# Altium footprint library LimeMicroAltiumLib.PcbLib: 760 footprints (part 39 of 50)
Each footprint in its own frame and in the unit in brackets; x right, y up, seen from the top. Pads: shape width x height; smd on the part's side, far side on the other; paste and mask are expansions set on the pad; w line width, h text height; cw(c..) or ccw(c..) is an arc to the next point about the centre after c.
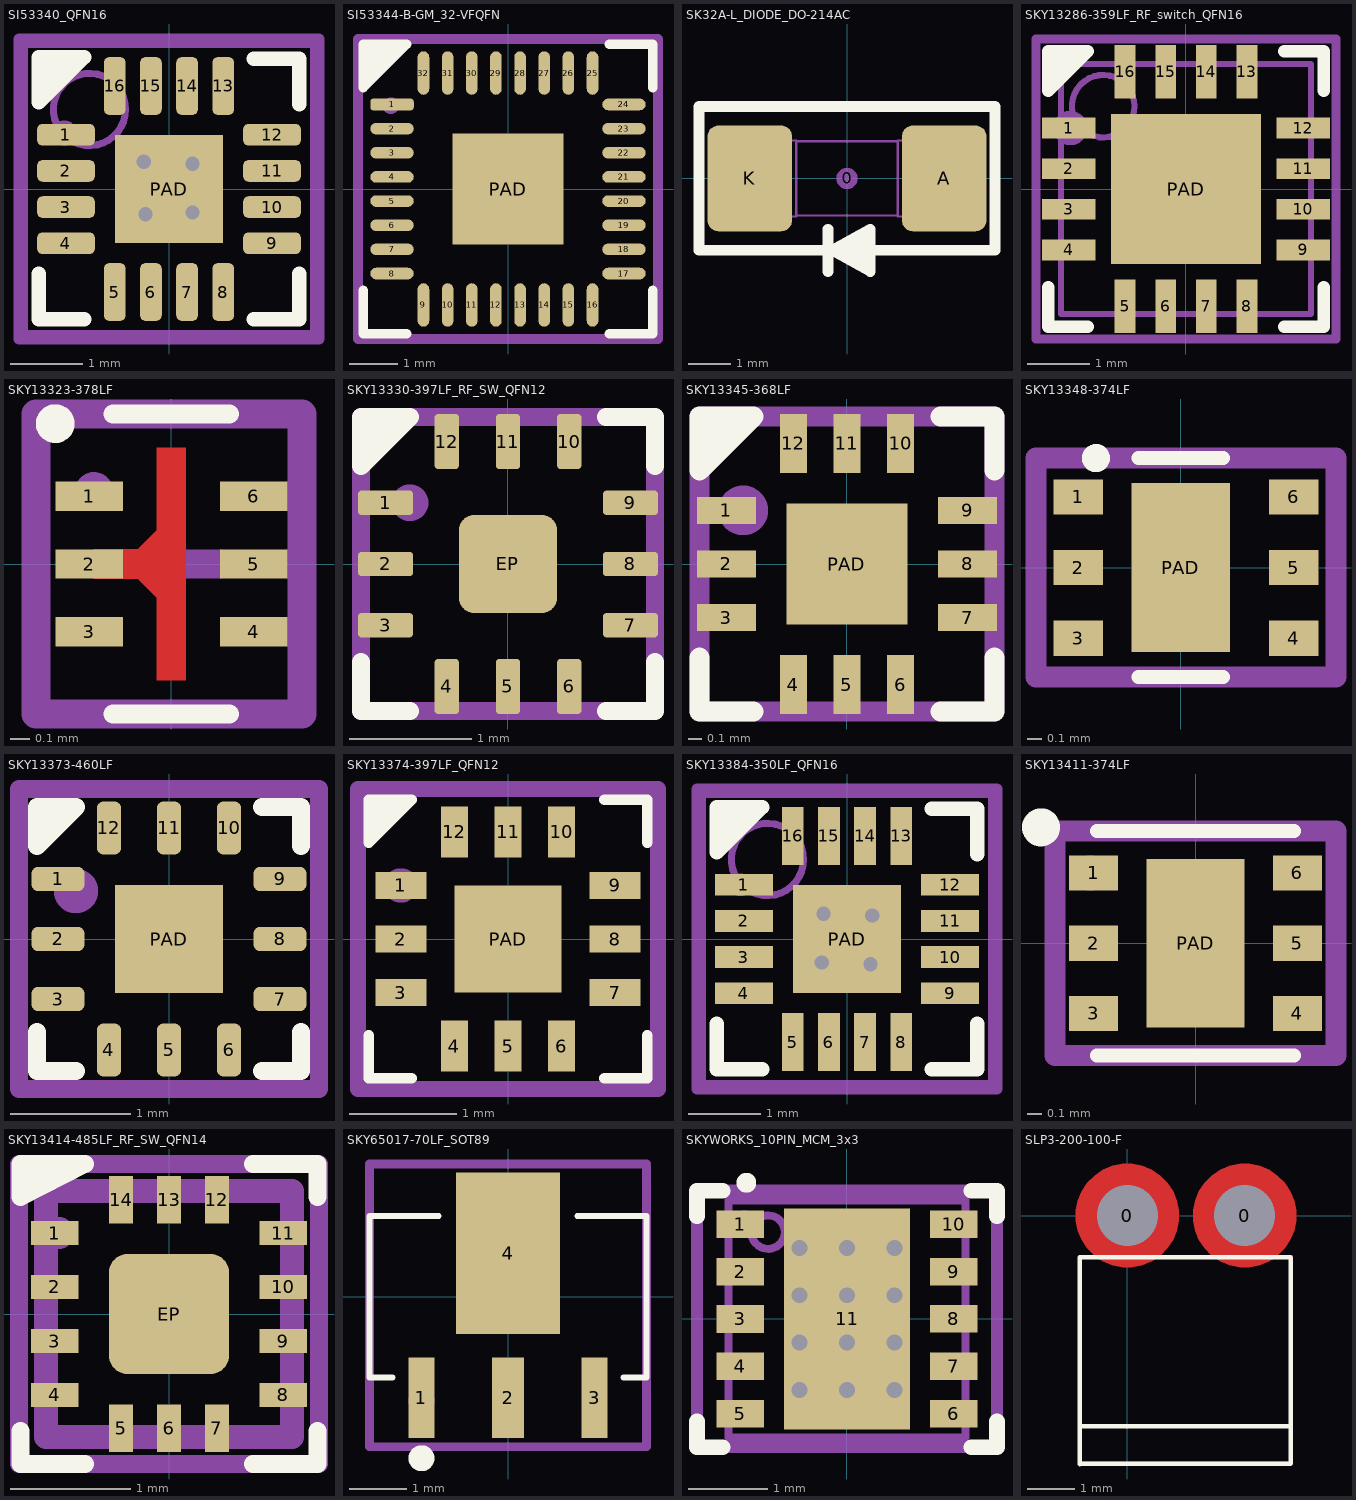
[diagram p38: the footprints below, top view; thin cyan lines are the x and y axes]

## SI53340_QFN16 [mm]
pads (17):
  rrect50% 0.8x0.3 smd mask+0.05: 1(-1.425,0.75) 2(-1.425,0.25) 3(-1.425,-0.25) 4(-1.425,-0.75) 9(1.425,-0.75) 10(1.425,-0.25) 11(1.425,0.25) 12(1.425,0.75)
  rrect50% 0.3x0.8 smd mask+0.05: 5(-0.75,-1.425) 6(-0.25,-1.425) 7(0.25,-1.425) 8(0.75,-1.425) 13(0.75,1.425) 14(0.25,1.425) 15(-0.25,1.425) 16(-0.75,1.425)
  rect 1.5x1.5 smd mask+0.05: PAD(0,0)
via -0.35,0.375 diameter 0.4 hole 0.2
via 0.325,0.35 diameter 0.4 hole 0.2
via 0.325,-0.325 diameter 0.4 hole 0.2
via -0.325,-0.35 diameter 0.4 hole 0.2
Top Overlay:
  region: -1.8,1.825 -1.8,1.2 -1.175,1.825
  lines w0.2: -1.8,-1.175 -1.8,-1.8 -1.175,-1.8 ; 1.175,-1.8 1.8,-1.8 1.8,-1.175 ; 1.175,1.8 1.8,1.8 1.8,1.175 ; -1.8,1.2 -1.175,1.825 -1.8,1.825 -1.8,1.2
Mechanical 13:
  circle w0.1: c-1.1,1.1 r0.5
  lines w0.1: -2,-2 2,-2 2,2 -2,2 -2,-2
Mechanical 15:
  circle w0.35: c-1.45,0.775 r0
  lines w0.15: -0.5,0 0.5,0 ; 0,-0.5 0,0.5 ; -2.075,-2.075 2.075,-2.075 2.075,2.075 -2.075,2.075 -2.075,-2.075
  text ".Designator" at 0,0 h0.55
3D body "User Library-qfn16-3x3.step": height 0.92, standoff 0, extent -1.5,-1.5 1.5,1.5

## SI53344-B-GM_32-VFQFN [mm]
pads (33):
  rrect50% 0.9x0.24 smd paste+0 mask+0.05: 1(-2.401,1.75)
  rrect100% 0.9x0.24 smd paste+0 mask+0.05: 2(-2.401,1.25) 3(-2.401,0.75) 4(-2.401,0.25) 5(-2.401,-0.25) 6(-2.401,-0.75) 7(-2.401,-1.25) 8(-2.401,-1.75) 17(2.401,-1.75) 18(2.401,-1.25) 19(2.401,-0.75) 20(2.401,-0.25) 21(2.401,0.25) 22(2.401,0.75) 23(2.401,1.25) 24(2.401,1.75)
  rrect100% 0.24x0.9 smd paste+0 mask+0.05: 9(-1.75,-2.401) 10(-1.25,-2.401) 11(-0.75,-2.401) 12(-0.25,-2.401) 13(0.25,-2.401) 14(0.75,-2.401) 15(1.25,-2.401) 16(1.75,-2.401) 25(1.75,2.401) 26(1.25,2.401) 27(0.75,2.401) 28(0.25,2.401) 29(-0.25,2.401) 30(-0.75,2.401) 31(-1.25,2.401) 32(-1.75,2.401)
  rect 2.3x2.3 smd paste+0 mask+0.05: PAD(0,0)
Top Overlay:
  region: -3,2.1 -3,3
  region: -3,2.1 -2.1,3 -3,3
  lines w0.2: -3,-2.1 -3,-3 -2.1,-3 ; 2.1,-3 3,-3 3,-2.1 ; 2.1,3 3,3 3,2.1 ; -3,2.1 -3,3 -2.1,3 -3,2.1
Mechanical 15:
  circle w0.2: c-2.425,1.725 r0.071
  lines w0.2: -0.85,0 0,0 ; 0,-0.85 0,0 ; 0,0.85 0,0 ; 0.85,0 0,0 ; -3.106,-3.106 -3.106,3.106 3.106,3.106 3.106,-3.106 -3.106,-3.106
  text ".Designator" at 0,0 h0.55
3D body "IC_Silicon_Labs_SI53344-B-GM_eec.STEP": height 0.25, standoff 0, extent -3.106,-3.106 3.106,3.106

## SK32A-L_DIODE_DO-214AC [mm]
pads (3):
  round 0.508 on Mech15: 0(0,0)
  rrect25% 2x2.5 smd: A(2.3,0) K(-2.3,0)
Top Overlay:
  lines w0.254: -0.45,-2.2 -0.45,-1.2 ; 0.05,-1.9 0.55,-1.9 ; 0.15,-1.5 0.55,-1.5 ; 0.55,-1.7 0.35,-1.7 -0.35,-1.7 ; -0.35,-1.7 0.55,-2.2 0.55,-1.2 -0.35,-1.7 ; -3.5,-1.7 -3.5,1.7 3.5,1.7 3.5,-1.7 -3.5,-1.7
Mechanical 13:
  lines w0.05: -1.2,-0.88 1.2,-0.88 ; -1.2,0.88 1.2,0.88 ; -1.7,-0.9 -1.7,0.9 -1.2,0.9 -1.2,-0.9 -1.7,-0.9 ; 1.2,-0.9 1.2,0.9 1.7,0.9 1.7,-0.9 1.2,-0.9
Mechanical 15:
  lines w0.15: -0.45,-2.2 -0.45,-1.2 ; 0.05,-1.9 0.55,-1.9 ; 0.15,-1.5 0.55,-1.5 ; 0.55,-1.7 0.35,-1.7 -0.35,-1.7 ; -0.35,-1.7 0.55,-1.2 0.55,-2.2 -0.35,-1.7 ; -3.5,-1.7 3.5,-1.7 3.5,1.7 -3.5,1.7 -3.5,-1.7
  text "A" at 1.7,-0.5 h0.55
  text "C" at -2.2,-0.5 h0.55
  text ".Designator" at 0,0 h0.55
3D body "User Library-DO-214AA SMB.step": height 2.3, standoff 0, extent -2.7,-1.8 2.7,1.8

## SKY13286-359LF_RF_switch_QFN16 [mm]
pads (17):
  rect 0.85x0.33 smd mask+0.05: 1(-1.875,0.975) 2(-1.875,0.325) 3(-1.875,-0.325) 4(-1.875,-0.975) 9(1.875,-0.975) 10(1.875,-0.325) 11(1.875,0.325) 12(1.875,0.975)
  rect 0.33x0.85 smd mask+0.05: 5(-0.975,-1.875) 6(-0.325,-1.875) 7(0.325,-1.875) 8(0.975,-1.875) 13(0.975,1.875) 14(0.325,1.875) 15(-0.325,1.875) 16(-0.975,1.875)
  rect 2.4x2.4 smd mask+0.05: PAD(0,0)
Top Overlay:
  region: -2.2,1.575 -2.2,2.2 -1.575,2.2
  lines w0.2: -2.2,-1.575 -2.2,-2.2 -1.575,-2.2 ; 1.575,-2.2 2.2,-2.2 2.2,-1.575 ; 1.575,2.2 2.2,2.2 2.2,1.575 ; -2.2,1.575 -2.2,2.2 -1.575,2.2 -2.2,1.575
Mechanical 13:
  circle w0.1: c-1.325,1.325 r0.5
  lines w0.1: -2,-2 -2,2 2,2 2,-2 -2,-2
Mechanical 15:
  circle w0.35: c-1.85,0.975 r0.1
  lines w0.15: -0.525,0.025 0.475,0.025 ; -0.025,-0.475 -0.025,0.525 ; -2.4,-2.4 -2.4,2.4 2.4,2.4 2.4,-2.4 -2.4,-2.4
  text ".Designator" at 0,0 h0.55
3D body "User Library-qfn16-4x4.step": height 0.92, standoff 0, extent -2,-2 2,2

## SKY13323-378LF [mm] "SKY13323-378LF RF switch"
pads (6):
  rect 0.35x0.15 smd paste-0.1 mask+0.05: 1(-0.425,0.35) 2(-0.425,0) 3(-0.425,-0.35) 4(0.425,-0.35) 5(0.425,0) 6(0.425,0.35)
Top Layer:
  region: -0.4,-0.075 -0.175,-0.075 -0.075,-0.175 -0.075,-0.6 0.075,-0.6 0.075,0 -0.4,0
  region: -0.4,0.075 -0.175,0.075 -0.075,0.175 -0.075,0.6 0.075,0.6 0.075,0 -0.4,0
Top Overlay:
  circle w0.1: c-0.6,0.725 r0.05
  lines w0.1: -0.3,-0.775 0.3,-0.775 ; -0.3,0.775 0.3,0.775
Top Paste:
  drawing of 24 lines, arcs and shapes, not listed
Mechanical 15:
  circle w0.1: c-0.4,0.375 r0.05
  lines w0.15: -0.25,0 0,0 ; 0,-0.25 0,0 ; 0,0.25 0,0 ; 0.25,0 0,0 ; -0.7,-0.775 -0.7,0.775 0.675,0.775 0.675,-0.775 -0.7,-0.775
  text ".Designator" at 0,0 h0.55
3D body: height 0.51, standoff 0.5, extent -0.425,0.225 -0.225,0.425
3D body: height 0.5, standoff 0, extent -0.5,-0.5 0.5,0.5

## SKY13330-397LF_RF_SW_QFN12 [mm]
pads (13):
  rrect30% 0.45x0.2 smd mask+0.05: 1(-1,0.5) 2(-1,0) 3(-1,-0.5) 7(1,-0.5) 8(1,0) 9(1,0.5)
  rrect30% 0.2x0.45 smd mask+0.05: 4(-0.5,-1) 5(0,-1) 6(0.5,-1) 10(0.5,1) 11(0,1) 12(-0.5,1)
  rrect30% 0.8x0.8 smd mask+0.05: EP(0,0)
Top Overlay:
  region: -1.2,0.8 -1.2,1.2 -0.8,1.2
  lines w0.15: -1.2,-0.8 -1.2,-1.2 -0.8,-1.2 ; 0.8,-1.2 1.2,-1.2 1.2,-0.8 ; 0.8,1.2 1.2,1.2 1.2,0.8 ; -1.2,0.8 -0.8,1.2 -1.2,1.2 -1.2,0.8
Mechanical 15:
  circle w0.2: c-0.8,0.5 r0.05
  lines w0.15: -0.3,0 0,0 ; 0,-0.3 0,0 ; 0,0.3 0,0 ; 0.3,0 0,0 ; -1.2,-1.2 1.2,-1.2 1.2,1.2 -1.2,1.2 -1.2,-1.2
  text ".Designator" at 0,0 h0.55
3D body: height 0.56, standoff 0, extent -0.899,0.6 -0.601,0.9
3D body: height 0.55, standoff 0, extent -1,-1 1,1

## SKY13345-368LF [mm]
pads (13):
  rect 0.44x0.2 smd mask+0.05: 1(-0.9,0.4) 2(-0.9,0) 3(-0.9,-0.4) 7(0.9,-0.4) 8(0.9,0) 9(0.9,0.4)
  rect 0.2x0.44 smd mask+0.05: 4(-0.4,-0.9) 5(0,-0.9) 6(0.4,-0.9) 10(0.4,0.9) 11(0,0.9) 12(-0.4,0.9)
  rect 0.9x0.9 smd mask+0.05: PAD(0,0)
Top Overlay:
  region: -1.1,0.65 -0.65,1.1 -1.1,1.1
  lines w0.15: -1.1,-0.7 -1.1,-1.1 -0.7,-1.1 ; 0.7,-1.1 1.1,-1.1 1.1,-0.7 ; 0.7,1.1 1.1,1.1 1.1,0.7 ; -1.1,0.7 -0.7,1.1 -1.1,1.1 -1.1,0.7
Mechanical 15:
  circle w0.3: c-0.775,0.4 r0.035
  lines w0.15: -0.2,0 0.2,0 ; 0,-0.2 0,0.2 ; -1.1,-1.1 -1.1,1.1 1.1,1.1 1.1,-1.1 -1.1,-1.1
  text ".Designator" at 0,0 h0.55
3D body: height 0.55, standoff 0, extent -1,-1 1,1
3D body: height 0.56, standoff 0, extent -0.849,0.65 -0.65,0.85

## SKY13348-374LF [mm] "SKY13348-374LF RF switch"
pads (7):
  rect 0.35x0.25 smd mask+0.05: 1(-0.725,0.5) 2(-0.725,0) 3(-0.725,-0.5) 4(0.8,-0.5) 5(0.8,0) 6(0.8,0.5)
  rect 0.7x1.2 smd mask+0.05: PAD(0,0)
Top Overlay:
  circle w0.1: c-0.6,0.775 r0.05
  lines w0.1: -0.3,-0.775 0.3,-0.775 ; -0.3,0.775 0.3,0.775
Mechanical 15:
  circle w0.1: c-0.75,0.5 r0.05
  lines w0.15: -0.25,0 0,0 ; 0,-0.25 0,0 ; 0,0.25 0,0 ; 0.25,0 0,0 ; -1.025,-0.775 -1.025,0.775 1.1,0.775 1.1,-0.775 -1.025,-0.775
  text ".Designator" at 0,0 h0.55
3D body: height 0.51, standoff 0.5, extent -0.625,0.45 -0.425,0.65
3D body: height 0.5, standoff 0, extent -0.725,-0.75 0.775,0.75

## SKY13373-460LF [mm]
pads (13):
  rrect50% 0.44x0.2 smd mask+0.05: 1(-0.925,0.5) 2(-0.925,0) 3(-0.925,-0.5) 7(0.925,-0.5) 8(0.925,0) 9(0.925,0.5)
  rrect50% 0.2x0.44 smd mask+0.05: 4(-0.5,-0.925) 5(0,-0.925) 6(0.5,-0.925) 10(0.5,0.925) 11(0,0.925) 12(-0.5,0.925)
  rect 0.9x0.9 smd mask+0.05: PAD(0,0)
Top Overlay:
  region: -1.1,0.775 -0.775,1.1 -1.1,1.1
  lines w0.15: -1.1,-0.775 -1.1,-1.1 -0.775,-1.1 ; 0.775,-1.1 1.1,-1.1 1.1,-0.775 ; 0.775,1.1 1.1,1.1 1.1,0.775 ; -1.1,0.775 -1.1,1.1 -0.775,1.1 -1.1,0.775
Mechanical 15:
  circle w0.3: c-0.775,0.4 r0.035
  lines w0.15: -0.2,0 0.2,0 ; 0,-0.2 0,0.2 ; -1.25,-1.25 1.25,-1.25 1.25,1.25 -1.25,1.25 -1.25,-1.25
  text ".Designator" at 0,0 h0.55
3D body: height 0.56, standoff 0, extent -0.849,0.65 -0.65,0.85
3D body: height 0.55, standoff 0, extent -1,-1 1,1

## SKY13374-397LF_QFN12 [mm]
pads (13):
  rect 0.475x0.25 smd mask+0.05: 1(-1,0.5) 2(-1,0) 3(-1,-0.5) 7(1,-0.5) 8(1,0) 9(1,0.5)
  rect 0.25x0.475 smd mask+0.05: 4(-0.5,-1) 5(0,-1) 6(0.5,-1) 10(0.5,1) 11(0,1) 12(-0.5,1)
  rect 1x1 smd mask+0.05: PAD(0,0)
Top Overlay:
  region: -1.3,0.85 -0.85,1.3 -1.3,1.3
  lines w0.1: -1.3,-0.9 -1.3,-1.3 -0.9,-1.3 ; 0.9,-1.3 1.3,-1.3 1.3,-0.9 ; 0.9,1.3 1.3,1.3 1.3,0.9 ; -1.3,0.9 -1.3,1.3 -0.9,1.3 -1.3,0.9
Top Solder:
  region: -0.662,-0.762 -0.763,-0.663 -0.725,-0.625 -0.625,-0.725
  region: 0.662,-0.762 0.763,-0.663 0.725,-0.625 0.625,-0.725
  region: 0.662,0.762 0.763,0.663 0.725,0.625 0.625,0.725
  region: -0.662,0.762 -0.763,0.663 -0.725,0.625 -0.625,0.725
Mechanical 15:
  circle w0.25: c-1,0.5 r0.035
  lines w0.15: -0.2,0 0.2,0 ; 0,-0.2 0,0.2 ; -1.4,-1.4 1.4,-1.4 1.4,1.4 -1.4,1.4 -1.4,-1.4
  text ".Designator" at 0,0 h0.55
3D body: height 0.55, standoff 0, extent -1,-1 1,1
3D body: height 0.58, standoff 0.53, extent -0.873,0.476 -0.475,0.875

## SKY13384-350LF_QFN16 [mm]
pads (17):
  rect 0.8x0.3 smd mask+0.05: 1(-1.425,0.75) 2(-1.425,0.25) 3(-1.425,-0.25) 4(-1.425,-0.75) 9(1.425,-0.75) 10(1.425,-0.25) 11(1.425,0.25) 12(1.425,0.75)
  rect 0.3x0.8 smd mask+0.05: 5(-0.75,-1.425) 6(-0.25,-1.425) 7(0.25,-1.425) 8(0.75,-1.425) 13(0.75,1.425) 14(0.25,1.425) 15(-0.25,1.425) 16(-0.75,1.425)
  rect 1.5x1.5 smd mask+0.05: PAD(0,0)
via -0.325,0.35 diameter 0.4 hole 0.2
via -0.35,-0.325 diameter 0.4 hole 0.2
via 0.325,-0.35 diameter 0.4 hole 0.2
via 0.35,0.325 diameter 0.4 hole 0.2
Top Overlay:
  region: -1.8,1.1 -1.075,1.825 -1.8,1.825
  lines w0.2: -1.8,-1.175 -1.8,-1.8 -1.175,-1.8 ; 1.175,-1.8 1.8,-1.8 1.8,-1.175 ; 1.175,1.8 1.8,1.8 1.8,1.175 ; -1.8,1.2 -1.175,1.825 -1.8,1.825 -1.8,1.2
Top Solder:
  region: -0.975,-0.875 -0.875,-0.975 -0.95,-1.05 -1.05,-0.95
  region: 0.975,-0.875 0.875,-0.975 0.95,-1.05 1.05,-0.95
  region: 0.975,0.875 0.875,0.975 0.95,1.05 1.05,0.95
  region: -0.975,0.875 -0.875,0.975 -0.95,1.05 -1.05,0.95
Mechanical 13:
  circle w0.1: c-1.1,1.1 r0.5
  lines w0.1: -2,-2 -2,2 2,2 2,-2 -2,-2
Mechanical 15:
  circle w0.2: c-1.475,0.75 r0.056
  lines w0.15: -0.5,0 0.5,0 ; 0,-0.5 0,0.5 ; -2.075,-2.075 -2.075,2.075 2.075,2.075 2.075,-2.075 -2.075,-2.075
  text ".Designator" at 0,0 h0.55
3D body "User Library-qfn16-3x3.step": height 0.92, standoff 0, extent -1.5,-1.5 1.5,1.5

## SKY13411-374LF [mm]
pads (7):
  rect 0.35x0.25 smd mask+0.05: 1(-0.725,0.5) 2(-0.725,0) 3(-0.725,-0.5) 4(0.725,-0.5) 5(0.725,0) 6(0.725,0.5)
  rect 0.7x1.2 smd mask+0.05: PAD(0,0)
Top Overlay:
  circle w0.2: c-1.1,0.825 r0.035
  lines w0.1: -0.7,-0.8 0.7,-0.8 ; -0.7,0.8 0.7,0.8
Mechanical 15:
  circle w0.2: c-0.75,0.5 r0.025
  lines w0.15: -0.2,0 0.2,0 ; 0,-0.2 0,0.2 ; -1,-0.8 -1,0.8 1,0.8 1,-0.8 -1,-0.8
  text ".Designator" at 0,0 h0.55
3D body "User Library-DFN 6 2x2_v2.STEP": height 0.48, standoff -0.03, extent -0.752,-0.75 0.751,0.75

## SKY13414-485LF_RF_SW_QFN14 [mm]
pads (15):
  rect 0.395x0.2 smd paste+0 mask+0.05: 1(-0.953,0.675) 2(-0.953,0.225) 3(-0.953,-0.225) 4(-0.953,-0.675) 8(0.953,-0.675) 9(0.953,-0.225) 10(0.953,0.225) 11(0.953,0.675)
  rect 0.2x0.395 smd paste+0 mask+0.05: 5(-0.4,-0.953) 6(0,-0.953) 7(0.4,-0.953) 12(0.4,0.953) 13(0,0.953) 14(-0.4,0.953)
  rrect30% 1x1 smd paste+0 mask+0.05: EP(0,0)
Top Overlay:
  region: -1.237,0.975 -1.237,1.25 -0.7,1.25
  lines w0.15: -1.237,-0.975 -1.237,-1.25 -0.7,-1.25 ; 0.7,-1.25 1.237,-1.25 1.237,-0.975 ; 0.7,1.25 1.237,1.25 1.237,0.975 ; -1.237,0.975 -1.237,1.25 -0.7,1.25 -1.237,0.975
Mechanical 13:
  lines w0.2: -1.025,-1.025 -1.025,1.025 1.025,1.025 1.025,-1.025 -1.025,-1.025
Mechanical 15:
  circle w0.2: c-0.925,0.675 r0.035
  lines w0.15: -0.375,0 0,0 ; 0,-0.375 0,0 ; 0,0.375 0,0 ; 0.375,0 0,0 ; -1.25,-1.25 -1.25,1.25 1.25,1.25 1.25,-1.25 -1.25,-1.25
  text ".Designator" at 0,0 h0.55
3D body "IC_Skyworks_Solutions_SKY13414-485LF_eec.STEP": height 0.25, standoff 0, extent -1.25,-1.25 1.25,1.25

## SKY65017-70LF_SOT89 [mm]
pads (4):
  rect 0.45x1.4 smd mask+0.05: 1(-1.5,-1.75) 3(1.5,-1.75)
  rect 0.55x1.4 smd mask+0.05: 2(0,-1.75)
  rect 1.8x2.8 smd mask+0.05: 4(0,0.75)
Top Overlay:
  circle w0.25: c-1.5,-2.8 r0.1
  lines w0.1: -2,-1.4 -2.4,-1.4 -2.4,1.4 -1.2,1.4 ; 1.2,1.4 2.4,1.4 2.4,-1.4 2,-1.4
Mechanical 15:
  circle w0.25: c-1.5,-1.8 r0.1
  lines w0.15: -0.2,0 0.2,0 ; 0,-0.2 0,0.2 ; -2.4,-2.6 2.4,-2.6 2.4,2.3 -2.4,2.3 -2.4,-2.6
  text ".Designator" at 0,0 h0.55
3D body "SW3dPS-SOT89.STEP": height 1.59, standoff -0.02, extent -2.314,-2.258 2.286,1.992

## SKYWORKS_10PIN_MCM_3x3 [mm]
height 0.8
pads (11):
  rect 0.6x0.35 smd mask+0.05: 1(-1.35,1.2) 2(-1.35,0.6) 3(-1.35,0) 4(-1.35,-0.6) 5(-1.35,-1.2) 6(1.35,-1.2) 7(1.35,-0.6) 8(1.35,0) 9(1.35,0.6) 10(1.35,1.2)
  rect 1.6x2.8 smd mask+0.05: 11(0,0)
via -0.6,-0.9 diameter 0.4 hole 0.2
via 0,-0.9 diameter 0.4 hole 0.2
via 0.6,-0.9 diameter 0.4 hole 0.2
via -0.6,-0.3 diameter 0.4 hole 0.2
via 0.6,-0.3 diameter 0.4 hole 0.2
via 0,-0.3 diameter 0.4 hole 0.2
via -0.6,0.3 diameter 0.4 hole 0.2
via 0,0.3 diameter 0.4 hole 0.2
via 0.6,0.3 diameter 0.4 hole 0.2
via -0.6,0.9 diameter 0.4 hole 0.2
via 0,0.9 diameter 0.4 hole 0.2
via 0.6,0.9 diameter 0.4 hole 0.2
Top Overlay:
  circle w0.2: c-1.275,1.725 r0.025
  lines w0.2: -1.9,-1.3 -1.9,-1.625 -1.575,-1.625 ; -1.9,1.3 -1.9,1.625 -1.575,1.625 ; 1.575,-1.625 1.9,-1.625 1.9,-1.3 ; 1.575,1.625 1.9,1.625 1.9,1.3
Mechanical 13:
  circle w0.1: c-1,1.1 r0.212
  lines w0.1: -1.5,-1.5 1.5,-1.5 1.5,1.5 -1.5,1.5 -1.5,-1.5
Mechanical 15:
  circle w0.35: c-1.3,1.2 r0
  lines w0.15: -0.5,0 0.5,0 ; 0,-0.5 0,0.5 ; -1.9,-1.625 1.9,-1.625 1.9,1.625 -1.9,1.625 -1.9,-1.625
  text ".Designator" at 0,0 h0.55
3D body: height 0.9, standoff 0, extent -1.5,-1.5 1.5,1.5

## SLP3-200-100-F [mm]
pads (2):
  round 0.9 hole 1.3 unplated: 0(0,0) 0(2.5,0)
Top Layer:
  pour cut-out: 0,0 0,1.1 0.108,1.1 0.321,1.058 0.521,0.975 0.701,0.854 0.854,0.701 0.975,0.521 1.058,0.321 1.1,0.108 1.1,0
  pour cut-out: 0,0 0,-1.1 -0.108,-1.1 -0.321,-1.058 -0.521,-0.975 -0.701,-0.854 -0.854,-0.701 -0.975,-0.521 -1.058,-0.321 -1.1,-0.108 -1.1,0
  pour cut-out: 0,0 -1.1,0 -1.1,0.108 -1.058,0.321 -0.975,0.521 -0.854,0.701 -0.701,0.854 -0.521,0.975 -0.321,1.058 -0.108,1.1 0,1.1
  pour cut-out: 0,0 1.1,0 1.1,-0.108 1.058,-0.321 0.975,-0.521 0.854,-0.701 0.701,-0.854 0.521,-0.975 0.321,-1.058 0.108,-1.1 0,-1.1
  pour cut-out: 2.5,0 2.5,1.1 2.608,1.1 2.821,1.058 3.021,0.975 3.201,0.854 3.354,0.701 3.475,0.521 3.558,0.321 3.6,0.108 3.6,0
  pour cut-out: 2.5,0 2.5,-1.1 2.392,-1.1 2.179,-1.058 1.979,-0.975 1.799,-0.854 1.646,-0.701 1.525,-0.521 1.442,-0.321 1.4,-0.108 1.4,0
  pour cut-out: 2.5,0 1.4,0 1.4,0.108 1.442,0.321 1.525,0.521 1.646,0.701 1.799,0.854 1.979,0.975 2.179,1.058 2.392,1.1 2.5,1.1
  pour cut-out: 2.5,0 3.6,0 3.6,-0.108 3.558,-0.321 3.475,-0.521 3.354,-0.701 3.201,-0.854 3.021,-0.975 2.821,-1.058 2.608,-1.1 2.5,-1.1
Top Overlay:
  lines w0.1: -1.016,-4.5 3.484,-4.489 3.484,-0.889 -1.016,-0.889 -1.016,-4.489 -1.016,-5.3 3.484,-5.289 3.484,-4.478
Top Solder:
  region: 1.1,0 1.1,0.108 1.058,0.321 0.975,0.521 0.854,0.701 0.701,0.854 0.521,0.975 0.321,1.058 0.108,1.1 0,1.1 0,0
  region: 0,1.1 -0.108,1.1 -0.321,1.058 -0.521,0.975 -0.701,0.854 -0.854,0.701 -0.975,0.521 -1.058,0.321 -1.1,0.108 -1.1,0 0,0
  region: -1.1,0 -1.1,-0.108 -1.058,-0.321 -0.975,-0.521 -0.854,-0.701 -0.701,-0.854 -0.521,-0.975 -0.321,-1.058 -0.108,-1.1 0,-1.1 0,0
  region: 0,-1.1 0.108,-1.1 0.321,-1.058 0.521,-0.975 0.701,-0.854 0.854,-0.701 0.975,-0.521 1.058,-0.321 1.1,-0.108 1.1,0 0,0
  region: 3.6,0 3.6,0.108 3.558,0.321 3.475,0.521 3.354,0.701 3.201,0.854 3.021,0.975 2.821,1.058 2.608,1.1 2.5,1.1 2.5,0
  region: 2.5,1.1 2.392,1.1 2.179,1.058 1.979,0.975 1.799,0.854 1.646,0.701 1.525,0.521 1.442,0.321 1.4,0.108 1.4,0 2.5,0
  region: 1.4,0 1.4,-0.108 1.442,-0.321 1.525,-0.521 1.646,-0.701 1.799,-0.854 1.979,-0.975 2.179,-1.058 2.392,-1.1 2.5,-1.1 2.5,0
  region: 2.5,-1.1 2.608,-1.1 2.821,-1.058 3.021,-0.975 3.201,-0.854 3.354,-0.701 3.475,-0.521 3.558,-0.321 3.6,-0.108 3.6,0 2.5,0
Mechanical 15:
  lines w0.076: -1.016,-5.289 -1.016,-0.889 3.484,-0.889 3.484,-5.289 -1.016,-5.289
3D body "SLP3-200-100-F--3DModel-STEP-56544.STEP": height 6.62, standoff -1.59, extent -1.041,-7.823 3.48,1.067